# Altium footprint library Package_SO.PcbLib: 333 footprints (part 21 of 21)
Each footprint in its own frame and in the unit in brackets; x right, y up, seen from the top. Pads: shape width x height; smd on the part's side, far side on the other; paste and mask are expansions set on the pad; w line width, h text height; cw(c..) or ccw(c..) is an arc to the next point about the centre after c.
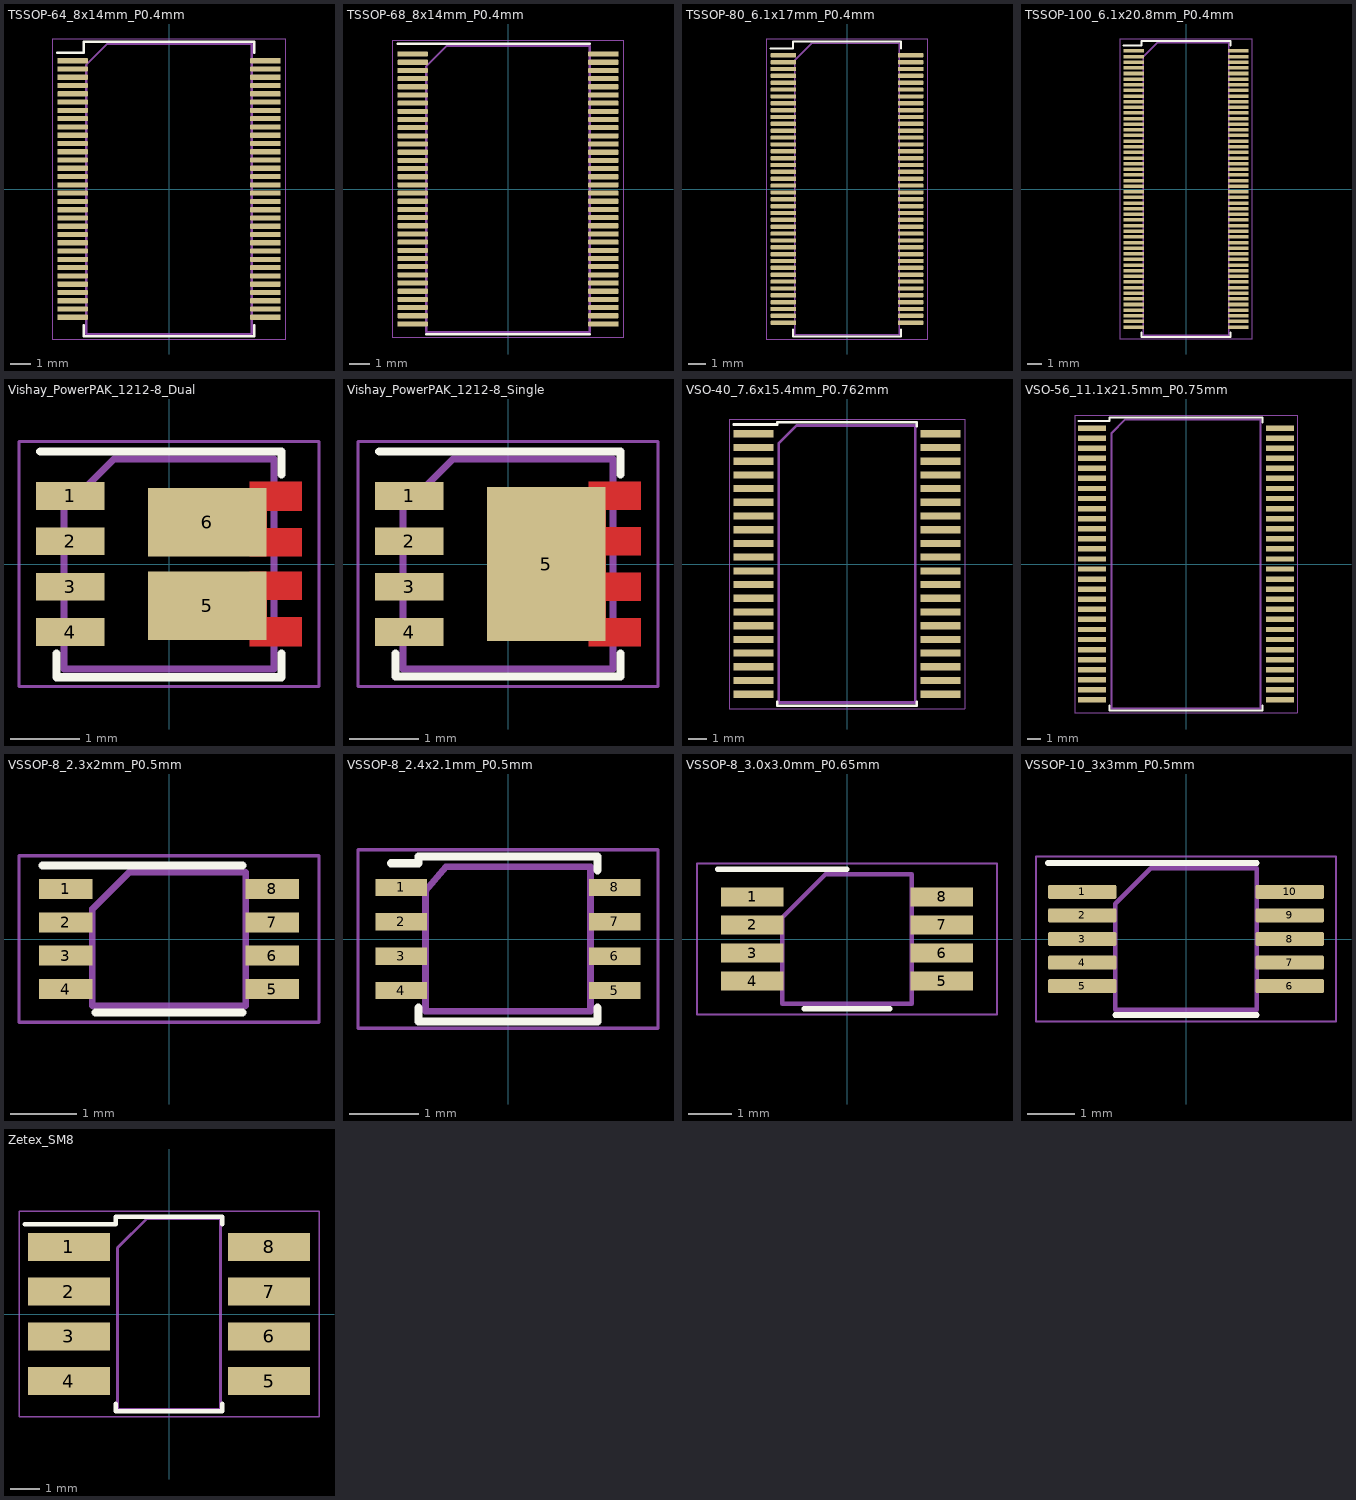
[diagram p20: the footprints below, top view; thin cyan lines are the x and y axes]

## TSSOP-64_8x14mm_P0.4mm [mm]
pads (64):
  rrect25% 1.475x0.25 smd: 1(-4.663,6.2) 2(-4.663,5.8) 3(-4.663,5.4) 4(-4.663,5) 5(-4.663,4.6) 6(-4.663,4.2) 7(-4.663,3.8) 8(-4.663,3.4) 9(-4.663,3) 10(-4.663,2.6) 11(-4.663,2.2) 12(-4.663,1.8) 13(-4.663,1.4) 14(-4.663,1) 15(-4.663,0.6) 16(-4.663,0.2) 17(-4.663,-0.2) 18(-4.663,-0.6) 19(-4.663,-1) 20(-4.663,-1.4) 21(-4.663,-1.8) 22(-4.663,-2.2) 23(-4.663,-2.6) 24(-4.663,-3) 25(-4.663,-3.4) 26(-4.663,-3.8) 27(-4.663,-4.2) 28(-4.663,-4.6) 29(-4.663,-5) 30(-4.663,-5.4) 31(-4.663,-5.8) 32(-4.663,-6.2) 33(4.663,-6.2) 34(4.663,-5.8) 35(4.663,-5.4) 36(4.663,-5) 37(4.663,-4.6) 38(4.663,-4.2) 39(4.663,-3.8) 40(4.663,-3.4) 41(4.663,-3) 42(4.663,-2.6) 43(4.663,-2.2) 44(4.663,-1.8) 45(4.663,-1.4) 46(4.663,-1) 47(4.663,-0.6) 48(4.663,-0.2) 49(4.663,0.2) 50(4.663,0.6) 51(4.663,1) 52(4.663,1.4) 53(4.663,1.8) 54(4.663,2.2) 55(4.663,2.6) 56(4.663,3) 57(4.663,3.4) 58(4.663,3.8) 59(4.663,4.2) 60(4.663,4.6) 61(4.663,5) 62(4.663,5.4) 63(4.663,5.8) 64(4.663,6.2)
F.SilkS:
  lines w0.12: -5.4,6.585 -4.11,6.585 -4.11,7.11 0,7.11 4.11,7.11 4.11,6.585 ; -4.11,-6.585 -4.11,-7.11 0,-7.11 4.11,-7.11 4.11,-6.585
F.CrtYd:
  lines w0.05: -5.65,-7.25 -5.65,7.25 5.65,7.25 5.65,-7.25 -5.65,-7.25
F.Fab:
  lines w0.1: -4,-7 -4,6 -3,7 4,7 4,-7 -4,-7
  text "'.Designator'" at -4.047,-0.84 h1

## TSSOP-68_8x14mm_P0.4mm [mm]
pads (68):
  rrect25% 1.475x0.25 smd: 1(-4.663,6.6) 2(-4.663,6.2) 3(-4.663,5.8) 4(-4.663,5.4) 5(-4.663,5) 6(-4.663,4.6) 7(-4.663,4.2) 8(-4.663,3.8) 9(-4.663,3.4) 10(-4.663,3) 11(-4.663,2.6) 12(-4.663,2.2) 13(-4.663,1.8) 14(-4.663,1.4) 15(-4.663,1) 16(-4.663,0.6) 17(-4.663,0.2) 18(-4.663,-0.2) 19(-4.663,-0.6) 20(-4.663,-1) 21(-4.663,-1.4) 22(-4.663,-1.8) 23(-4.663,-2.2) 24(-4.663,-2.6) 25(-4.663,-3) 26(-4.663,-3.4) 27(-4.663,-3.8) 28(-4.663,-4.2) 29(-4.663,-4.6) 30(-4.663,-5) 31(-4.663,-5.4) 32(-4.663,-5.8) 33(-4.663,-6.2) 34(-4.663,-6.6) 35(4.663,-6.6) 36(4.663,-6.2) 37(4.663,-5.8) 38(4.663,-5.4) 39(4.663,-5) 40(4.663,-4.6) 41(4.663,-4.2) 42(4.663,-3.8) 43(4.663,-3.4) 44(4.663,-3) 45(4.663,-2.6) 46(4.663,-2.2) 47(4.663,-1.8) 48(4.663,-1.4) 49(4.663,-1) 50(4.663,-0.6) 51(4.663,-0.2) 52(4.663,0.2) 53(4.663,0.6) 54(4.663,1) 55(4.663,1.4) 56(4.663,1.8) 57(4.663,2.2) 58(4.663,2.6) 59(4.663,3) 60(4.663,3.4) 61(4.663,3.8) 62(4.663,4.2) 63(4.663,4.6) 64(4.663,5) 65(4.663,5.4) 66(4.663,5.8) 67(4.663,6.2) 68(4.663,6.6)
F.SilkS:
  lines w0.12: -5.4,7.11 0,7.11 4,7.11 ; -4,-7.11 0,-7.11 4,-7.11
F.CrtYd:
  lines w0.05: -5.65,-7.25 -5.65,7.25 5.65,7.25 5.65,-7.25 -5.65,-7.25
F.Fab:
  lines w0.1: -4,-7 4,-7 4,7 -3,7 -4,6 -4,-7
  text "'.Designator'" at -4.047,-0.84 h1

## TSSOP-80_6.1x17mm_P0.4mm [mm]
pads (80):
  rrect25% 1.475x0.25 smd: 1(-3.712,7.8) 2(-3.712,7.4) 3(-3.712,7) 4(-3.712,6.6) 5(-3.712,6.2) 6(-3.712,5.8) 7(-3.712,5.4) 8(-3.712,5) 9(-3.712,4.6) 10(-3.712,4.2) 11(-3.712,3.8) 12(-3.712,3.4) 13(-3.712,3) 14(-3.712,2.6) 15(-3.712,2.2) 16(-3.712,1.8) 17(-3.712,1.4) 18(-3.712,1) 19(-3.712,0.6) 20(-3.712,0.2) 21(-3.712,-0.2) 22(-3.712,-0.6) 23(-3.712,-1) 24(-3.712,-1.4) 25(-3.712,-1.8) 26(-3.712,-2.2) 27(-3.712,-2.6) 28(-3.712,-3) 29(-3.712,-3.4) 30(-3.712,-3.8) 31(-3.712,-4.2) 32(-3.712,-4.6) 33(-3.712,-5) 34(-3.712,-5.4) 35(-3.712,-5.8) 36(-3.712,-6.2) 37(-3.712,-6.6) 38(-3.712,-7) 39(-3.712,-7.4) 40(-3.712,-7.8) 41(3.712,-7.8) 42(3.712,-7.4) 43(3.712,-7) 44(3.712,-6.6) 45(3.712,-6.2) 46(3.712,-5.8) 47(3.712,-5.4) 48(3.712,-5) 49(3.712,-4.6) 50(3.712,-4.2) 51(3.712,-3.8) 52(3.712,-3.4) 53(3.712,-3) 54(3.712,-2.6) 55(3.712,-2.2) 56(3.712,-1.8) 57(3.712,-1.4) 58(3.712,-1) 59(3.712,-0.6) 60(3.712,-0.2) 61(3.712,0.2) 62(3.712,0.6) 63(3.712,1) 64(3.712,1.4) 65(3.712,1.8) 66(3.712,2.2) 67(3.712,2.6) 68(3.712,3) 69(3.712,3.4) 70(3.712,3.8) 71(3.712,4.2) 72(3.712,4.6) 73(3.712,5) 74(3.712,5.4) 75(3.712,5.8) 76(3.712,6.2) 77(3.712,6.6) 78(3.712,7) 79(3.712,7.4) 80(3.712,7.8)
F.SilkS:
  lines w0.12: -4.45,8.185 -3.16,8.185 -3.16,8.61 0,8.61 3.16,8.61 3.16,8.185 ; -3.16,-8.185 -3.16,-8.61 0,-8.61 3.16,-8.61 3.16,-8.185
F.CrtYd:
  lines w0.05: -4.7,-8.75 -4.7,8.75 4.7,8.75 4.7,-8.75 -4.7,-8.75
F.Fab:
  lines w0.1: -3.05,-8.5 3.05,-8.5 3.05,8.5 -2.05,8.5 -3.05,7.5 -3.05,-8.5
  text "'.Designator'" at -4.047,-0.84 h1

## TSSOP-100_6.1x20.8mm_P0.4mm [mm]
pads (100):
  rrect25% 1.475x0.25 smd: 1(-3.712,9.8) 2(-3.712,9.4) 3(-3.712,9) 4(-3.712,8.6) 5(-3.712,8.2) 6(-3.712,7.8) 7(-3.712,7.4) 8(-3.712,7) 9(-3.712,6.6) 10(-3.712,6.2) 11(-3.712,5.8) 12(-3.712,5.4) 13(-3.712,5) 14(-3.712,4.6) 15(-3.712,4.2) 16(-3.712,3.8) 17(-3.712,3.4) 18(-3.712,3) 19(-3.712,2.6) 20(-3.712,2.2) 21(-3.712,1.8) 22(-3.712,1.4) 23(-3.712,1) 24(-3.712,0.6) 25(-3.712,0.2) 26(-3.712,-0.2) 27(-3.712,-0.6) 28(-3.712,-1) 29(-3.712,-1.4) 30(-3.712,-1.8) 31(-3.712,-2.2) 32(-3.712,-2.6) 33(-3.712,-3) 34(-3.712,-3.4) 35(-3.712,-3.8) 36(-3.712,-4.2) 37(-3.712,-4.6) 38(-3.712,-5) 39(-3.712,-5.4) 40(-3.712,-5.8) 41(-3.712,-6.2) 42(-3.712,-6.6) 43(-3.712,-7) 44(-3.712,-7.4) 45(-3.712,-7.8) 46(-3.712,-8.2) 47(-3.712,-8.6) 48(-3.712,-9) 49(-3.712,-9.4) 50(-3.712,-9.8) 51(3.712,-9.8) 52(3.712,-9.4) 53(3.712,-9) 54(3.712,-8.6) 55(3.712,-8.2) 56(3.712,-7.8) 57(3.712,-7.4) 58(3.712,-7) 59(3.712,-6.6) 60(3.712,-6.2) 61(3.712,-5.8) 62(3.712,-5.4) 63(3.712,-5) 64(3.712,-4.6) 65(3.712,-4.2) 66(3.712,-3.8) 67(3.712,-3.4) 68(3.712,-3) 69(3.712,-2.6) 70(3.712,-2.2) 71(3.712,-1.8) 72(3.712,-1.4) 73(3.712,-1) 74(3.712,-0.6) 75(3.712,-0.2) 76(3.712,0.2) 77(3.712,0.6) 78(3.712,1) 79(3.712,1.4) 80(3.712,1.8) 81(3.712,2.2) 82(3.712,2.6) 83(3.712,3) 84(3.712,3.4) 85(3.712,3.8) 86(3.712,4.2) 87(3.712,4.6) 88(3.712,5) 89(3.712,5.4) 90(3.712,5.8) 91(3.712,6.2) 92(3.712,6.6) 93(3.712,7) 94(3.712,7.4) 95(3.712,7.8) 96(3.712,8.2) 97(3.712,8.6) 98(3.712,9) 99(3.712,9.4) 100(3.712,9.8)
F.SilkS:
  lines w0.12: -4.45,10.185 -3.16,10.185 -3.16,10.51 0,10.51 3.16,10.51 3.16,10.185 ; -3.16,-10.185 -3.16,-10.51 0,-10.51 3.16,-10.51 3.16,-10.185
F.CrtYd:
  lines w0.05: -4.7,-10.65 4.7,-10.65 4.7,10.65 -4.7,10.65 -4.7,-10.65
F.Fab:
  lines w0.1: -3.05,-10.4 3.05,-10.4 3.05,10.4 -2.05,10.4 -3.05,9.4 -3.05,-10.4
  text "'.Designator'" at -4.047,-0.84 h1

## Vishay_PowerPAK_1212-8_Dual [mm]
pads (6):
  rect 0.99x0.405 smd: 1(-1.435,0.99) 2(-1.435,0.33) 3(-1.435,-0.33) 4(-1.435,-0.99)
  rect 1.725x0.99 smd: 5(0.557,-0.607) 6(0.557,0.607)
F.Cu:
  region: 1.93,-0.517 1.42,-0.517 1.42,-0.773 1.93,-0.773 1.93,-1.195 1.17,-1.195 1.17,-0.112 1.93,-0.112
  region: 1.93,0.773 1.42,0.773 1.42,0.517 1.93,0.517 1.93,0.112 1.17,0.112 1.17,1.195 1.93,1.195
F.SilkS:
  lines w0.12: -1.87,1.635 1.635,1.635 1.635,1.3 ; -1.635,-1.645 1.635,-1.645 ; -1.635,-1.635 -1.635,-1.3 ; 1.635,-1.635 1.635,-1.3
F.Paste:
  region: 1.93,-0.517 1.42,-0.517 1.42,-0.773 1.93,-0.773 1.93,-1.195 1.17,-1.195 1.17,-0.112 1.93,-0.112
  region: 1.93,0.773 1.42,0.773 1.42,0.517 1.93,0.517 1.93,0.112 1.17,0.112 1.17,1.195 1.93,1.195
F.Mask:
  region: 1.93,-0.517 1.42,-0.517 1.42,-0.773 1.93,-0.773 1.93,-1.195 1.17,-1.195 1.17,-0.112 1.93,-0.112
  region: 1.93,0.773 1.42,0.773 1.42,0.517 1.93,0.517 1.93,0.112 1.17,0.112 1.17,1.195 1.93,1.195
F.CrtYd:
  lines w0.05: -2.18,-1.78 -2.18,1.78 2.18,1.78 2.18,-1.78 -2.18,-1.78
F.Fab:
  lines w0.1: -1.525,-1.525 1.525,-1.525 1.525,1.525 -0.8,1.525 -1.525,0.8 -1.525,-1.525
  text "'.Designator'" at -2.833,-0.588 h0.7

## Vishay_PowerPAK_1212-8_Single [mm]
pads (5):
  rect 0.99x0.405 smd: 1(-1.435,0.99) 2(-1.435,0.33) 3(-1.435,-0.33) 4(-1.435,-0.99)
  rect 1.725x2.235 smd: 5(0.557,0)
F.Cu:
  region: 1.93,0.787 1.42,0.787 1.42,0.533 1.93,0.533 1.93,0.128 1.42,0.128 1.42,-0.128 1.93,-0.128 1.93,-0.533 1.42,-0.533 1.42,-0.787 1.93,-0.787 1.93,-1.195 1.17,-1.195 1.17,1.195 1.93,1.195
F.SilkS:
  lines w0.12: -1.87,1.635 1.635,1.635 1.635,1.3 ; -1.635,-1.3 -1.635,-1.635 1.635,-1.635 1.635,-1.3
F.Paste:
  region: 1.93,0.787 1.42,0.787 1.42,0.533 1.93,0.533 1.93,0.128 1.42,0.128 1.42,-0.128 1.93,-0.128 1.93,-0.533 1.42,-0.533 1.42,-0.787 1.93,-0.787 1.93,-1.195 1.17,-1.195 1.17,1.195 1.93,1.195
F.Mask:
  region: 1.93,0.787 1.42,0.787 1.42,0.533 1.93,0.533 1.93,0.128 1.42,0.128 1.42,-0.128 1.93,-0.128 1.93,-0.533 1.42,-0.533 1.42,-0.787 1.93,-0.787 1.93,-1.195 1.17,-1.195 1.17,1.195 1.93,1.195
F.CrtYd:
  lines w0.05: -2.18,-1.78 2.18,-1.78 2.18,1.78 -2.18,1.78 -2.18,-1.78
F.Fab:
  lines w0.1: -1.525,-1.525 -1.525,0.8 -0.8,1.525 1.525,1.525 1.525,-1.525 -1.525,-1.525
  text "'.Designator'" at -2.833,-0.588 h0.7

## VSO-40_7.6x15.4mm_P0.762mm [mm]
pads (40):
  rect 2.2x0.4 smd: 1(-5.2,7.239) 2(-5.2,6.477) 3(-5.2,5.715) 4(-5.2,4.953) 5(-5.2,4.191) 6(-5.2,3.429) 7(-5.2,2.667) 8(-5.2,1.905) 9(-5.2,1.143) 10(-5.2,0.381) 11(-5.2,-0.381) 12(-5.2,-1.143) 13(-5.2,-1.905) 14(-5.2,-2.667) 15(-5.2,-3.429) 16(-5.2,-4.191) 17(-5.2,-4.953) 18(-5.2,-5.715) 19(-5.2,-6.477) 20(-5.2,-7.239) 21(5.2,-7.239) 22(5.2,-6.477) 23(5.2,-5.715) 24(5.2,-4.953) 25(5.2,-4.191) 26(5.2,-3.429) 27(5.2,-2.667) 28(5.2,-1.905) 29(5.2,-1.143) 30(5.2,-0.381) 31(5.2,0.381) 32(5.2,1.143) 33(5.2,1.905) 34(5.2,2.667) 35(5.2,3.429) 36(5.2,4.191) 37(5.2,4.953) 38(5.2,5.715) 39(5.2,6.477) 40(5.2,7.239)
F.SilkS:
  lines w0.15: -6.3,7.75 -3.875,7.75 -3.875,7.875 3.875,7.875 3.875,7.664 ; -3.875,-7.664 -3.875,-7.875 3.875,-7.875 3.875,-7.664
F.CrtYd:
  lines w0.05: -6.55,-8.05 -6.55,8.05 6.55,8.05 6.55,-8.05 -6.55,-8.05
F.Fab:
  lines w0.15: -3.8,-7.7 3.8,-7.7 3.8,7.7 -2.8,7.7 -3.8,6.7 -3.8,-7.7
  text "'.Designator'" at -3.267,-0.702 h0.8

## VSO-56_11.1x21.5mm_P0.75mm [mm]
pads (56):
  rect 2.1x0.4 smd: 1(-7,10.125) 2(-7,9.375) 3(-7,8.625) 4(-7,7.875) 5(-7,7.125) 6(-7,6.375) 7(-7,5.625) 8(-7,4.875) 9(-7,4.125) 10(-7,3.375) 11(-7,2.625) 12(-7,1.875) 13(-7,1.125) 14(-7,0.375) 15(-7,-0.375) 16(-7,-1.125) 17(-7,-1.875) 18(-7,-2.625) 19(-7,-3.375) 20(-7,-4.125) 21(-7,-4.875) 22(-7,-5.625) 23(-7,-6.375) 24(-7,-7.125) 25(-7,-7.875) 26(-7,-8.625) 27(-7,-9.375) 28(-7,-10.125) 29(7,-10.125) 30(7,-9.375) 31(7,-8.625) 32(7,-7.875) 33(7,-7.125) 34(7,-6.375) 35(7,-5.625) 36(7,-4.875) 37(7,-4.125) 38(7,-3.375) 39(7,-2.625) 40(7,-1.875) 41(7,-1.125) 42(7,-0.375) 43(7,0.375) 44(7,1.125) 45(7,1.875) 46(7,2.625) 47(7,3.375) 48(7,4.125) 49(7,4.875) 50(7,5.625) 51(7,6.375) 52(7,7.125) 53(7,7.875) 54(7,8.625) 55(7,9.375) 56(7,10.125)
F.SilkS:
  lines w0.15: -8.025,10.65 -5.7,10.65 -5.7,10.9 5.7,10.9 5.7,10.55 ; -5.7,-10.55 -5.7,-10.9 5.7,-10.9 5.7,-10.55
F.CrtYd:
  lines w0.05: -8.3,-11.1 8.3,-11.1 8.3,11.1 -8.3,11.1 -8.3,-11.1
F.Fab:
  lines w0.15: -5.55,-10.75 -5.55,9.75 -4.55,10.75 5.55,10.75 5.55,-10.75 -5.55,-10.75
  text "'.Designator'" at -3.267,-0.702 h0.8

## VSSOP-8_2.3x2mm_P0.5mm [mm]
pads (8):
  rect 0.8x0.3 smd: 1(-1.55,0.75) 2(-1.55,0.25) 3(-1.55,-0.25) 4(-1.55,-0.75) 5(1.55,-0.75) 6(1.55,-0.25) 7(1.55,0.25) 8(1.55,0.75)
F.SilkS:
  lines w0.12: -1.9,1.1 1.1,1.1 ; -1.1,-1.1 1.1,-1.1
F.CrtYd:
  lines w0.05: -2.25,-1.25 -2.25,1.25 2.25,1.25 2.25,-1.25 -2.25,-1.25
F.Fab:
  lines w0.1: -1.15,-1 -1.15,0.45 -0.6,1 1.15,1 1.15,-1 -1.15,-1
  text "'.Designator'" at -2.048,-0.445 h0.5

## VSSOP-8_2.4x2.1mm_P0.5mm [mm]
pads (8):
  rect 0.75x0.25 smd: 1(-1.55,0.75) 2(-1.55,0.25) 3(-1.55,-0.25) 4(-1.55,-0.75) 5(1.55,-0.75) 6(1.55,-0.25) 7(1.55,0.25) 8(1.55,0.75)
F.SilkS:
  lines w0.12: -1.7,1.1 -1.3,1.1 -1.3,1.2 1.3,1.2 1.3,1 ; -1.3,-1 -1.3,-1.2 1.3,-1.2 1.3,-1
F.CrtYd:
  lines w0.05: -2.18,-1.3 2.18,-1.3 2.18,1.3 -2.18,1.3 -2.18,-1.3
F.Fab:
  lines w0.1: -1.2,-1.05 1.2,-1.05 1.2,1.05 -0.9,1.05 -1.2,0.7 -1.2,-1.05
  text "'.Designator'" at -2.048,-0.445 h0.5

## VSSOP-8_3.0x3.0mm_P0.65mm [mm]
pads (8):
  rect 1.45x0.45 smd: 1(-2.2,0.975) 2(-2.2,0.325) 3(-2.2,-0.325) 4(-2.2,-0.975) 5(2.2,-0.975) 6(2.2,-0.325) 7(2.2,0.325) 8(2.2,0.975)
F.SilkS:
  lines w0.12: -3,1.62 0,1.62 ; -1,-1.62 1,-1.62
F.CrtYd:
  lines w0.05: -3.48,-1.75 -3.48,1.75 3.48,1.75 3.48,-1.75 -3.48,-1.75
F.Fab:
  lines w0.1: -1.5,-1.5 -1.5,0.5 -0.5,1.5 1.5,1.5 1.5,-1.5 -1.5,-1.5
  text "'.Designator'" at -2.048,-0.445 h0.5

## VSSOP-10_3x3mm_P0.5mm [mm]
pads (10):
  rrect25% 1.45x0.3 smd: 1(-2.2,1) 2(-2.2,0.5) 3(-2.2,0) 4(-2.2,-0.5) 5(-2.2,-1) 6(2.2,-1) 7(2.2,-0.5) 8(2.2,0) 9(2.2,0.5) 10(2.2,1)
F.SilkS:
  lines w0.12: -2.925,1.61 0,1.61 1.5,1.61 ; -1.5,-1.61 0,-1.61 1.5,-1.61
F.CrtYd:
  lines w0.05: -3.18,-1.75 -3.18,1.75 3.18,1.75 3.18,-1.75 -3.18,-1.75
F.Fab:
  lines w0.1: -1.5,-1.5 1.5,-1.5 1.5,1.5 -0.75,1.5 -1.5,0.75 -1.5,-1.5
  text "'.Designator'" at -3.033,-0.628 h0.75

## Zetex_SM8 [mm]
pads (8):
  rect 2.8x0.95 smd: 1(-3.4,2.28) 2(-3.4,0.76) 3(-3.4,-0.76) 4(-3.4,-2.28) 5(3.4,-2.28) 6(3.4,-0.76) 7(3.4,0.76) 8(3.4,2.28)
F.SilkS:
  lines w0.15: -4.9,3.05 -1.81,3.05 -1.81,3.31 1.81,3.31 1.81,3.05 ; -1.81,-3.05 -1.81,-3.31 1.81,-3.31 1.81,-3.05
F.CrtYd:
  lines w0.05: -5.1,-3.5 -5.1,3.5 5.1,3.5 5.1,-3.5 -5.1,-3.5
F.Fab:
  lines w0.1: -1.75,-3.25 -1.75,2.25 -0.75,3.25 1.75,3.25 1.75,-3.25 -1.75,-3.25
  text "'.Designator'" at 0.84,-4.047 h1